# Altium schematic symbol library jlcpcb_2025_04_capacitors_extended_0402.schlib: 3594 symbols (part 1 of 20) (continued)
## 0402B105K6R3CT
designator C?  Capacitance: 1uF  (hidden comment: *)
Capacitor, Ceramic (MLCC), 1uF, 6.3V, X7R, SMD 0402; Manufacturer: Walsin Tech Corp; Manufacturer Part Number: 0402B105K6R3CT; Package Size: 0402; JLCPCB Basic Part: No; JLCPCB Part Number: C2918635; Supplier 1: LCSC; Category: Capacitors - MLCC; Supplier Part Number 1: C2918635; Voltage Rating: 6.3V; Temperature Coefficient: X7R; RoHS: Yes; ComponentLink1Description: Datasheet; ComponentLink1URL: https://wmsc.lcsc.com/wmsc/upload/file/pdf/v2/lcsc/2111171830_Walsin-Tech-Corp-0402B105K6R3CT_C2918635.pdf; ComponentLink2Description: JLCPCB Part URL; ComponentLink2URL: https://jlcpcb.com/partdetail/C2918635; ComponentLink3Description: LCSC Part URL; ComponentLink3URL: https://lcsc.com/product-detail/Multilayer-Ceramic-Capacitors-MLCC---SMD-SMT_Walsin-Tech-Corp-Walsin-Tech-Corp-0402B105K6R3CT_C2918635.html
footprint CAP-0402 (0402 (1005M) Capacitor)
pins: 1, 2

## 0402B105K6R3NT
designator C?  Capacitance: 1uF  (hidden comment: *)
Capacitor, Ceramic (MLCC), 1uF, ±10%, 6.3V, X7R, ±10%, SMD 0402; Manufacturer: FH (Guangdong Fenghua Advanced Tech); Manufacturer Part Number: 0402B105K6R3NT; Package Size: 0402; JLCPCB Basic Part: No; JLCPCB Part Number: C5445354; Supplier 1: LCSC; Category: Capacitors - MLCC; Supplier Part Number 1: C5445354; Tolerance: ±10%; Voltage Rating: 6.3V; Temperature Coefficient: X7R; RoHS: Yes; ComponentLink1Description: Datasheet; ComponentLink1URL: https://wmsc.lcsc.com/wmsc/upload/file/pdf/v2/lcsc/2304271702_FH--Guangdong-Fenghua-Advanced-Tech-0402B105K6R3NT_C5445354.pdf; ComponentLink2Description: JLCPCB Part URL; ComponentLink2URL: https://jlcpcb.com/partdetail/C5445354; ComponentLink3Description: LCSC Part URL; ComponentLink3URL: https://lcsc.com/product-detail/Multilayer-Ceramic-Capacitors-MLCC---SMD-SMT_FH-Guangdong-Fenghua-Advanced-Tech-FH-Guangdong-Fenghua-Advanced-Tech-0402B105K6R3NT_C5445354.html
footprint CAP-0402 (0402 (1005M) Capacitor)
pins: 1, 2

## 0402B121K500CT
designator C?  Capacitance: 120pF  (hidden comment: *)
Capacitor, Ceramic (MLCC), 120pF, ±10%, 50V, X7R, ±10%, SMD 0402; Manufacturer: Walsin Tech Corp; Manufacturer Part Number: 0402B121K500CT; Package Size: 0402; JLCPCB Basic Part: No; JLCPCB Part Number: C152813; Supplier 1: LCSC; Category: Capacitors - MLCC; Supplier Part Number 1: C152813; Tolerance: ±10%; Voltage Rating: 50V; Temperature Coefficient: X7R; RoHS: Yes; ComponentLink1Description: Datasheet; ComponentLink1URL: https://wmsc.lcsc.com/wmsc/upload/file/pdf/v2/lcsc/2304140030_Walsin-Tech-Corp-0402B121K500CT_C152813.pdf; ComponentLink2Description: JLCPCB Part URL; ComponentLink2URL: https://jlcpcb.com/partdetail/C152813; ComponentLink3Description: LCSC Part URL; ComponentLink3URL: https://lcsc.com/product-detail/Multilayer-Ceramic-Capacitors-MLCC---SMD-SMT_Walsin-Tech-Corp-Walsin-Tech-Corp-0402B121K500CT_C152813.html
footprint CAP-0402 (0402 (1005M) Capacitor)
pins: 1, 2

## 0402B121K500NT
designator C?  Capacitance: 120pF  (hidden comment: *)
Capacitor, Ceramic (MLCC), 120pF, ±10%, 50V, X7R, ±10%, SMD 0402; Manufacturer: FH(Guangdong Fenghua Advanced Tech); Manufacturer Part Number: 0402B121K500NT; Package Size: 0402; JLCPCB Basic Part: No; JLCPCB Part Number: C285005; Supplier 1: LCSC; Category: Capacitors - MLCC; Supplier Part Number 1: C285005; Tolerance: ±10%; Voltage Rating: 50V; Temperature Coefficient: X7R; RoHS: Yes; ComponentLink1Description: Datasheet; ComponentLink1URL: https://wmsc.lcsc.com/wmsc/upload/file/pdf/v2/lcsc/2304140030_FH--Guangdong-Fenghua-Advanced-Tech-0402B121K500NT_C285005.pdf; ComponentLink2Description: JLCPCB Part URL; ComponentLink2URL: https://jlcpcb.com/partdetail/C285005; ComponentLink3Description: LCSC Part URL; ComponentLink3URL: https://lcsc.com/product-detail/Multilayer-Ceramic-Capacitors-MLCC---SMD-SMT_FH-Guangdong-Fenghua-Advanced-Tech-FH-Guangdong-Fenghua-Advanced-Tech-0402B121K500NT_C285005.html
footprint CAP-0402 (0402 (1005M) Capacitor)
pins: 1, 2

## 0402B122J500CT
designator C?  Capacitance: 1.2nF  (hidden comment: *)
Capacitor, Ceramic (MLCC), 1.2nF, ±5%, 50V, X7R, ±5%, SMD 0402; Manufacturer: Walsin Tech Corp; Manufacturer Part Number: 0402B122J500CT; Package Size: 0402; JLCPCB Basic Part: No; JLCPCB Part Number: C295919; Supplier 1: LCSC; Category: Capacitors - MLCC; Supplier Part Number 1: C295919; Tolerance: ±5%; Voltage Rating: 50V; Temperature Coefficient: X7R; RoHS: Yes; ComponentLink1Description: Datasheet; ComponentLink1URL: https://wmsc.lcsc.com/wmsc/upload/file/pdf/v2/lcsc/2304140030_Walsin-Tech-Corp-0402B122J500CT_C295919.pdf; ComponentLink2Description: JLCPCB Part URL; ComponentLink2URL: https://jlcpcb.com/partdetail/C295919; ComponentLink3Description: LCSC Part URL; ComponentLink3URL: https://lcsc.com/product-detail/Multilayer-Ceramic-Capacitors-MLCC---SMD-SMT_Walsin-Tech-Corp-Walsin-Tech-Corp-0402B122J500CT_C295919.html
footprint CAP-0402 (0402 (1005M) Capacitor)
pins: 1, 2

## 0402B122K250CT
designator C?  Capacitance: 1.2nF  (hidden comment: *)
Capacitor, Ceramic (MLCC), 1.2nF, ±10%, 25V, X7R, ±10%, SMD 0402; Manufacturer: Walsin Tech Corp; Manufacturer Part Number: 0402B122K250CT; Package Size: 0402; JLCPCB Basic Part: No; JLCPCB Part Number: C458850; Supplier 1: LCSC; Category: Capacitors - MLCC; Supplier Part Number 1: C458850; Tolerance: ±10%; Voltage Rating: 25V; Temperature Coefficient: X7R; RoHS: Yes; ComponentLink1Description: Datasheet; ComponentLink1URL: https://wmsc.lcsc.com/wmsc/upload/file/pdf/v2/lcsc/2304140030_Walsin-Tech-Corp-0402B122K250CT_C458850.pdf; ComponentLink2Description: JLCPCB Part URL; ComponentLink2URL: https://jlcpcb.com/partdetail/C458850; ComponentLink3Description: LCSC Part URL; ComponentLink3URL: https://lcsc.com/product-detail/Multilayer-Ceramic-Capacitors-MLCC---SMD-SMT_Walsin-Tech-Corp-Walsin-Tech-Corp-0402B122K250CT_C458850.html
footprint CAP-0402 (0402 (1005M) Capacitor)
pins: 1, 2

## 0402B122K500CT
designator C?  Capacitance: 1.2nF  (hidden comment: *)
Capacitor, Ceramic (MLCC), 1.2nF, ±10%, 50V, X7R, ±10%, SMD 0402; Manufacturer: Walsin Tech Corp; Manufacturer Part Number: 0402B122K500CT; Package Size: 0402; JLCPCB Basic Part: No; JLCPCB Part Number: C295920; Supplier 1: LCSC; Category: Capacitors - MLCC; Supplier Part Number 1: C295920; Tolerance: ±10%; Voltage Rating: 50V; Temperature Coefficient: X7R; RoHS: Yes; ComponentLink1Description: Datasheet; ComponentLink1URL: https://wmsc.lcsc.com/wmsc/upload/file/pdf/v2/lcsc/2304140030_Walsin-Tech-Corp-0402B122K500CT_C295920.pdf; ComponentLink2Description: JLCPCB Part URL; ComponentLink2URL: https://jlcpcb.com/partdetail/C295920; ComponentLink3Description: LCSC Part URL; ComponentLink3URL: https://lcsc.com/product-detail/Multilayer-Ceramic-Capacitors-MLCC---SMD-SMT_Walsin-Tech-Corp-Walsin-Tech-Corp-0402B122K500CT_C295920.html
footprint CAP-0402 (0402 (1005M) Capacitor)
pins: 1, 2

## 0402B122K500NT
designator C?  Capacitance: 1.2nF  (hidden comment: *)
Capacitor, Ceramic (MLCC), 1.2nF, ±10%, 50V, X7R, ±10%, SMD 0402; Manufacturer: FH(Guangdong Fenghua Advanced Tech); Manufacturer Part Number: 0402B122K500NT; Package Size: 0402; JLCPCB Basic Part: No; JLCPCB Part Number: C192386; Supplier 1: LCSC; Category: Capacitors - MLCC; Supplier Part Number 1: C192386; Tolerance: ±10%; Voltage Rating: 50V; Temperature Coefficient: X7R; RoHS: Yes; ComponentLink1Description: Datasheet; ComponentLink1URL: https://wmsc.lcsc.com/wmsc/upload/file/pdf/v2/lcsc/1811141751_FH--Guangdong-Fenghua-Advanced-Tech-0402B122K500NT_C192386.pdf; ComponentLink2Description: JLCPCB Part URL; ComponentLink2URL: https://jlcpcb.com/partdetail/C192386; ComponentLink3Description: LCSC Part URL; ComponentLink3URL: https://lcsc.com/product-detail/Multilayer-Ceramic-Capacitors-MLCC---SMD-SMT_FH-Guangdong-Fenghua-Advanced-Tech-FH-Guangdong-Fenghua-Advanced-Tech-0402B122K500NT_C192386.html
footprint CAP-0402 (0402 (1005M) Capacitor)
pins: 1, 2

## 0402B122M500CT
designator C?  Capacitance: 1.2nF  (hidden comment: *)
Capacitor, Ceramic (MLCC), 1.2nF, ±20%, 50V, X7R, ±20%, SMD 0402; Manufacturer: Walsin Tech Corp; Manufacturer Part Number: 0402B122M500CT; Package Size: 0402; JLCPCB Basic Part: No; JLCPCB Part Number: C295921; Supplier 1: LCSC; Category: Capacitors - MLCC; Supplier Part Number 1: C295921; Tolerance: ±20%; Voltage Rating: 50V; Temperature Coefficient: X7R; RoHS: Yes; ComponentLink1Description: Datasheet; ComponentLink1URL: https://wmsc.lcsc.com/wmsc/upload/file/pdf/v2/lcsc/2304140030_Walsin-Tech-Corp-0402B122M500CT_C295921.pdf; ComponentLink2Description: JLCPCB Part URL; ComponentLink2URL: https://jlcpcb.com/partdetail/C295921; ComponentLink3Description: LCSC Part URL; ComponentLink3URL: https://lcsc.com/product-detail/Multilayer-Ceramic-Capacitors-MLCC---SMD-SMT_Walsin-Tech-Corp-Walsin-Tech-Corp-0402B122M500CT_C295921.html
footprint CAP-0402 (0402 (1005M) Capacitor)
pins: 1, 2

## 0402B123K250CT
designator C?  Capacitance: 12nF  (hidden comment: *)
Capacitor, Ceramic (MLCC), 12nF, ±10%, 25V, X7R, ±10%, SMD 0402; Manufacturer: Walsin Tech Corp; Manufacturer Part Number: 0402B123K250CT; Package Size: 0402; JLCPCB Basic Part: No; JLCPCB Part Number: C152812; Supplier 1: LCSC; Category: Capacitors - MLCC; Supplier Part Number 1: C152812; Tolerance: ±10%; Voltage Rating: 25V; Temperature Coefficient: X7R; RoHS: Yes; ComponentLink1Description: Datasheet; ComponentLink1URL: https://wmsc.lcsc.com/wmsc/upload/file/pdf/v2/lcsc/2304140030_Walsin-Tech-Corp-0402B123K250CT_C152812.pdf; ComponentLink2Description: JLCPCB Part URL; ComponentLink2URL: https://jlcpcb.com/partdetail/C152812; ComponentLink3Description: LCSC Part URL; ComponentLink3URL: https://lcsc.com/product-detail/Multilayer-Ceramic-Capacitors-MLCC---SMD-SMT_Walsin-Tech-Corp-Walsin-Tech-Corp-0402B123K250CT_C152812.html
footprint CAP-0402 (0402 (1005M) Capacitor)
pins: 1, 2

## 0402B123K500CT
designator C?  Capacitance: 12nF  (hidden comment: *)
Capacitor, Ceramic (MLCC), 12nF, ±10%, 50V, X7R, ±10%, SMD 0402; Manufacturer: Walsin Tech Corp; Manufacturer Part Number: 0402B123K500CT; Package Size: 0402; JLCPCB Basic Part: No; JLCPCB Part Number: C908520; Supplier 1: LCSC; Category: Capacitors - MLCC; Supplier Part Number 1: C908520; Tolerance: ±10%; Voltage Rating: 50V; Temperature Coefficient: X7R; RoHS: Yes; ComponentLink1Description: Datasheet; ComponentLink1URL: https://wmsc.lcsc.com/wmsc/upload/file/pdf/v2/lcsc/2010271906_Walsin-Tech-Corp-0402B123K500CT_C908520.pdf; ComponentLink2Description: JLCPCB Part URL; ComponentLink2URL: https://jlcpcb.com/partdetail/C908520; ComponentLink3Description: LCSC Part URL; ComponentLink3URL: https://lcsc.com/product-detail/Multilayer-Ceramic-Capacitors-MLCC---SMD-SMT_Walsin-Tech-Corp-Walsin-Tech-Corp-0402B123K500CT_C908520.html
footprint CAP-0402 (0402 (1005M) Capacitor)
pins: 1, 2

## 0402B151K500CT
designator C?  Capacitance: 150pF  (hidden comment: *)
Capacitor, Ceramic (MLCC), 150pF, ±10%, 50V, X7R, ±10%, SMD 0402; Manufacturer: Walsin Tech Corp; Manufacturer Part Number: 0402B151K500CT; Package Size: 0402; JLCPCB Basic Part: No; JLCPCB Part Number: C152811; Supplier 1: LCSC; Category: Capacitors - MLCC; Supplier Part Number 1: C152811; Tolerance: ±10%; Voltage Rating: 50V; Temperature Coefficient: X7R; RoHS: Yes; ComponentLink1Description: Datasheet; ComponentLink1URL: https://wmsc.lcsc.com/wmsc/upload/file/pdf/v2/lcsc/2304140030_Walsin-Tech-Corp-0402B151K500CT_C152811.pdf; ComponentLink2Description: JLCPCB Part URL; ComponentLink2URL: https://jlcpcb.com/partdetail/C152811; ComponentLink3Description: LCSC Part URL; ComponentLink3URL: https://lcsc.com/product-detail/Multilayer-Ceramic-Capacitors-MLCC---SMD-SMT_Walsin-Tech-Corp-Walsin-Tech-Corp-0402B151K500CT_C152811.html
footprint CAP-0402 (0402 (1005M) Capacitor)
pins: 1, 2

## 0402B151K500NT
designator C?  Capacitance: 150pF  (hidden comment: *)
Capacitor, Ceramic (MLCC), 150pF, ±10%, 50V, X7R, ±10%, SMD 0402; Manufacturer: FH(Guangdong Fenghua Advanced Tech); Manufacturer Part Number: 0402B151K500NT; Package Size: 0402; JLCPCB Basic Part: No; JLCPCB Part Number: C1527; Supplier 1: LCSC; Category: Capacitors - MLCC; Supplier Part Number 1: C1527; Tolerance: ±10%; Voltage Rating: 50V; Temperature Coefficient: X7R; RoHS: Yes; ComponentLink1Description: Datasheet; ComponentLink1URL: https://wmsc.lcsc.com/wmsc/upload/file/pdf/v2/lcsc/2304140030_FH--Guangdong-Fenghua-Advanced-Tech-0402B151K500NT_C1527.pdf; ComponentLink2Description: JLCPCB Part URL; ComponentLink2URL: https://jlcpcb.com/partdetail/C1527; ComponentLink3Description: LCSC Part URL; ComponentLink3URL: https://lcsc.com/product-detail/Multilayer-Ceramic-Capacitors-MLCC---SMD-SMT_FH-Guangdong-Fenghua-Advanced-Tech-FH-Guangdong-Fenghua-Advanced-Tech-0402B151K500NT_C1527.html
footprint CAP-0402 (0402 (1005M) Capacitor)
pins: 1, 2

## 0402B152J500CT
designator C?  Capacitance: 1.5nF  (hidden comment: *)
Capacitor, Ceramic (MLCC), 1.5nF, ±5%, 50V, X7R, ±5%, SMD 0402; Manufacturer: Walsin Tech Corp; Manufacturer Part Number: 0402B152J500CT; Package Size: 0402; JLCPCB Basic Part: No; JLCPCB Part Number: C424860; Supplier 1: LCSC; Category: Capacitors - MLCC; Supplier Part Number 1: C424860; Tolerance: ±5%; Voltage Rating: 50V; Temperature Coefficient: X7R; RoHS: Yes; ComponentLink1Description: Datasheet; ComponentLink1URL: https://wmsc.lcsc.com/wmsc/upload/file/pdf/v2/lcsc/2304140030_Walsin-Tech-Corp-0402B152J500CT_C424860.pdf; ComponentLink2Description: JLCPCB Part URL; ComponentLink2URL: https://jlcpcb.com/partdetail/C424860; ComponentLink3Description: LCSC Part URL; ComponentLink3URL: https://lcsc.com/product-detail/Multilayer-Ceramic-Capacitors-MLCC---SMD-SMT_Walsin-Tech-Corp-Walsin-Tech-Corp-0402B152J500CT_C424860.html
footprint CAP-0402 (0402 (1005M) Capacitor)
pins: 1, 2

## 0402B152K160CT
designator C?  Capacitance: 1.5nF  (hidden comment: *)
Capacitor, Ceramic (MLCC), 1.5nF, ±10%, 16V, X7R, ±10%, SMD 0402; Manufacturer: Walsin Tech Corp; Manufacturer Part Number: 0402B152K160CT; Package Size: 0402; JLCPCB Basic Part: No; JLCPCB Part Number: C424827; Supplier 1: LCSC; Category: Capacitors - MLCC; Supplier Part Number 1: C424827; Tolerance: ±10%; Voltage Rating: 16V; Temperature Coefficient: X7R; RoHS: Yes; ComponentLink1Description: Datasheet; ComponentLink1URL: https://wmsc.lcsc.com/wmsc/upload/file/pdf/v2/lcsc/2304140030_Walsin-Tech-Corp-0402B152K160CT_C424827.pdf; ComponentLink2Description: JLCPCB Part URL; ComponentLink2URL: https://jlcpcb.com/partdetail/C424827; ComponentLink3Description: LCSC Part URL; ComponentLink3URL: https://lcsc.com/product-detail/Multilayer-Ceramic-Capacitors-MLCC---SMD-SMT_Walsin-Tech-Corp-Walsin-Tech-Corp-0402B152K160CT_C424827.html
footprint CAP-0402 (0402 (1005M) Capacitor)
pins: 1, 2

## 0402B152K500CT
designator C?  Capacitance: 1.5nF  (hidden comment: *)
Capacitor, Ceramic (MLCC), 1.5nF, ±10%, 50V, X7R, ±10%, SMD 0402; Manufacturer: Walsin Tech Corp; Manufacturer Part Number: 0402B152K500CT; Package Size: 0402; JLCPCB Basic Part: No; JLCPCB Part Number: C123440; Supplier 1: LCSC; Category: Capacitors - MLCC; Supplier Part Number 1: C123440; Tolerance: ±10%; Voltage Rating: 50V; Temperature Coefficient: X7R; RoHS: Yes; ComponentLink1Description: Datasheet; ComponentLink1URL: https://wmsc.lcsc.com/wmsc/upload/file/pdf/v2/lcsc/2304140030_Walsin-Tech-Corp-0402B152K500CT_C123440.pdf; ComponentLink2Description: JLCPCB Part URL; ComponentLink2URL: https://jlcpcb.com/partdetail/C123440; ComponentLink3Description: LCSC Part URL; ComponentLink3URL: https://lcsc.com/product-detail/Multilayer-Ceramic-Capacitors-MLCC---SMD-SMT_Walsin-Tech-Corp-Walsin-Tech-Corp-0402B152K500CT_C123440.html
footprint CAP-0402 (0402 (1005M) Capacitor)
pins: 1, 2

## 0402B152K500NT
designator C?  Capacitance: 1.5nF  (hidden comment: *)
Capacitor, Ceramic (MLCC), 1.5nF, ±10%, 50V, X7R, ±10%, SMD 0402; Manufacturer: FH(Guangdong Fenghua Advanced Tech); Manufacturer Part Number: 0402B152K500NT; Package Size: 0402; JLCPCB Basic Part: No; JLCPCB Part Number: C284989; Supplier 1: LCSC; Category: Capacitors - MLCC; Supplier Part Number 1: C284989; Tolerance: ±10%; Voltage Rating: 50V; Temperature Coefficient: X7R; RoHS: Yes; ComponentLink1Description: Datasheet; ComponentLink1URL: https://wmsc.lcsc.com/wmsc/upload/file/pdf/v2/lcsc/2304140030_FH--Guangdong-Fenghua-Advanced-Tech-0402B152K500NT_C284989.pdf; ComponentLink2Description: JLCPCB Part URL; ComponentLink2URL: https://jlcpcb.com/partdetail/C284989; ComponentLink3Description: LCSC Part URL; ComponentLink3URL: https://lcsc.com/product-detail/Multilayer-Ceramic-Capacitors-MLCC---SMD-SMT_FH-Guangdong-Fenghua-Advanced-Tech-FH-Guangdong-Fenghua-Advanced-Tech-0402B152K500NT_C284989.html
footprint CAP-0402 (0402 (1005M) Capacitor)
pins: 1, 2

## 0402B152M500CT
designator C?  Capacitance: 1.5nF  (hidden comment: *)
Capacitor, Ceramic (MLCC), 1.5nF, ±20%, 50V, X7R, ±20%, SMD 0402; Manufacturer: Walsin Tech Corp; Manufacturer Part Number: 0402B152M500CT; Package Size: 0402; JLCPCB Basic Part: No; JLCPCB Part Number: C295923; Supplier 1: LCSC; Category: Capacitors - MLCC; Supplier Part Number 1: C295923; Tolerance: ±20%; Voltage Rating: 50V; Temperature Coefficient: X7R; RoHS: Yes; ComponentLink1Description: Datasheet; ComponentLink1URL: https://wmsc.lcsc.com/wmsc/upload/file/pdf/v2/lcsc/2304140030_Walsin-Tech-Corp-0402B152M500CT_C295923.pdf; ComponentLink2Description: JLCPCB Part URL; ComponentLink2URL: https://jlcpcb.com/partdetail/C295923; ComponentLink3Description: LCSC Part URL; ComponentLink3URL: https://lcsc.com/product-detail/Multilayer-Ceramic-Capacitors-MLCC---SMD-SMT_Walsin-Tech-Corp-Walsin-Tech-Corp-0402B152M500CT_C295923.html
footprint CAP-0402 (0402 (1005M) Capacitor)
pins: 1, 2

## 0402B152M500NT
designator C?  Capacitance: 1.5nF  (hidden comment: *)
Capacitor, Ceramic (MLCC), 1.5nF, ±20%, 50V, X7R, ±20%, SMD 0402; Manufacturer: FH(Guangdong Fenghua Advanced Tech); Manufacturer Part Number: 0402B152M500NT; Package Size: 0402; JLCPCB Basic Part: No; JLCPCB Part Number: C285109; Supplier 1: LCSC; Category: Capacitors - MLCC; Supplier Part Number 1: C285109; Tolerance: ±20%; Voltage Rating: 50V; Temperature Coefficient: X7R; RoHS: Yes; ComponentLink1Description: Datasheet; ComponentLink1URL: https://wmsc.lcsc.com/wmsc/upload/file/pdf/v2/lcsc/2304140030_FH--Guangdong-Fenghua-Advanced-Tech-0402B152M500NT_C285109.pdf; ComponentLink2Description: JLCPCB Part URL; ComponentLink2URL: https://jlcpcb.com/partdetail/C285109; ComponentLink3Description: LCSC Part URL; ComponentLink3URL: https://lcsc.com/product-detail/Multilayer-Ceramic-Capacitors-MLCC---SMD-SMT_FH-Guangdong-Fenghua-Advanced-Tech-FH-Guangdong-Fenghua-Advanced-Tech-0402B152M500NT_C285109.html
footprint CAP-0402 (0402 (1005M) Capacitor)
pins: 1, 2

## 0402B153K100CT
designator C?  Capacitance: 15nF  (hidden comment: *)
Capacitor, Ceramic (MLCC), 15nF, ±10%, 10V, X7R, ±10%, SMD 0402; Manufacturer: Walsin Tech Corp; Manufacturer Part Number: 0402B153K100CT; Package Size: 0402; JLCPCB Basic Part: No; JLCPCB Part Number: C387942; Supplier 1: LCSC; Category: Capacitors - MLCC; Supplier Part Number 1: C387942; Tolerance: ±10%; Voltage Rating: 10V; Temperature Coefficient: X7R; RoHS: Yes; ComponentLink1Description: Datasheet; ComponentLink1URL: https://wmsc.lcsc.com/wmsc/upload/file/pdf/v2/lcsc/2304140030_Walsin-Tech-Corp-0402B153K100CT_C387942.pdf; ComponentLink2Description: JLCPCB Part URL; ComponentLink2URL: https://jlcpcb.com/partdetail/C387942; ComponentLink3Description: LCSC Part URL; ComponentLink3URL: https://lcsc.com/product-detail/Multilayer-Ceramic-Capacitors-MLCC---SMD-SMT_Walsin-Tech-Corp-Walsin-Tech-Corp-0402B153K100CT_C387942.html
footprint CAP-0402 (0402 (1005M) Capacitor)
pins: 1, 2

## 0402B153K160CT
designator C?  Capacitance: 15nF  (hidden comment: *)
Capacitor, Ceramic (MLCC), 15nF, ±10%, 16V, X7R, ±10%, SMD 0402; Manufacturer: Walsin Tech Corp; Manufacturer Part Number: 0402B153K160CT; Package Size: 0402; JLCPCB Basic Part: No; JLCPCB Part Number: C301932; Supplier 1: LCSC; Category: Capacitors - MLCC; Supplier Part Number 1: C301932; Tolerance: ±10%; Voltage Rating: 16V; Temperature Coefficient: X7R; RoHS: Yes; ComponentLink1Description: Datasheet; ComponentLink1URL: https://wmsc.lcsc.com/wmsc/upload/file/pdf/v2/lcsc/2304140030_Walsin-Tech-Corp-0402B153K160CT_C301932.pdf; ComponentLink2Description: JLCPCB Part URL; ComponentLink2URL: https://jlcpcb.com/partdetail/C301932; ComponentLink3Description: LCSC Part URL; ComponentLink3URL: https://lcsc.com/product-detail/Multilayer-Ceramic-Capacitors-MLCC---SMD-SMT_Walsin-Tech-Corp-Walsin-Tech-Corp-0402B153K160CT_C301932.html
footprint CAP-0402 (0402 (1005M) Capacitor)
pins: 1, 2

## 0402B153K250NT
designator C?  Capacitance: 15nF  (hidden comment: *)
Capacitor, Ceramic (MLCC), 15nF, ±10%, 25V, X7R, ±10%, SMD 0402; Manufacturer: FH(Guangdong Fenghua Advanced Tech); Manufacturer Part Number: 0402B153K250NT; Package Size: 0402; JLCPCB Basic Part: No; JLCPCB Part Number: C285020; Supplier 1: LCSC; Category: Capacitors - MLCC; Supplier Part Number 1: C285020; Tolerance: ±10%; Voltage Rating: 25V; Temperature Coefficient: X7R; RoHS: Yes; ComponentLink1Description: Datasheet; ComponentLink1URL: https://wmsc.lcsc.com/wmsc/upload/file/pdf/v2/lcsc/2304140030_FH--Guangdong-Fenghua-Advanced-Tech-0402B153K250NT_C285020.pdf; ComponentLink2Description: JLCPCB Part URL; ComponentLink2URL: https://jlcpcb.com/partdetail/C285020; ComponentLink3Description: LCSC Part URL; ComponentLink3URL: https://lcsc.com/product-detail/Multilayer-Ceramic-Capacitors-MLCC---SMD-SMT_FH-Guangdong-Fenghua-Advanced-Tech-FH-Guangdong-Fenghua-Advanced-Tech-0402B153K250NT_C285020.html
footprint CAP-0402 (0402 (1005M) Capacitor)
pins: 1, 2

## 0402B153K500CT
designator C?  Capacitance: 15nF  (hidden comment: *)
Capacitor, Ceramic (MLCC), 15nF, ±10%, 50V, X7R, ±10%, SMD 0402; Manufacturer: Walsin Tech Corp; Manufacturer Part Number: 0402B153K500CT; Package Size: 0402; JLCPCB Basic Part: No; JLCPCB Part Number: C2443197; Supplier 1: LCSC; Category: Capacitors - MLCC; Supplier Part Number 1: C2443197; Tolerance: ±10%; Voltage Rating: 50V; Temperature Coefficient: X7R; RoHS: Yes; ComponentLink1Description: Datasheet; ComponentLink1URL: https://wmsc.lcsc.com/wmsc/upload/file/pdf/v2/lcsc/2309201533_Walsin-Tech-Corp-0402B153K500CT_C2443197.pdf; ComponentLink2Description: JLCPCB Part URL; ComponentLink2URL: https://jlcpcb.com/partdetail/C2443197; ComponentLink3Description: LCSC Part URL; ComponentLink3URL: https://lcsc.com/product-detail/Multilayer-Ceramic-Capacitors-MLCC---SMD-SMT_Walsin-Tech-Corp-Walsin-Tech-Corp-0402B153K500CT_C2443197.html
footprint CAP-0402 (0402 (1005M) Capacitor)
pins: 1, 2

## 0402B153K500NT
designator C?  Capacitance: 15nF  (hidden comment: *)
Capacitor, Ceramic (MLCC), 15nF, ±10%, 50V, X7R, ±10%, SMD 0402; Manufacturer: FH(Guangdong Fenghua Advanced Tech); Manufacturer Part Number: 0402B153K500NT; Package Size: 0402; JLCPCB Basic Part: No; JLCPCB Part Number: C501821; Supplier 1: LCSC; Category: Capacitors - MLCC; Supplier Part Number 1: C501821; Tolerance: ±10%; Voltage Rating: 50V; Temperature Coefficient: X7R; RoHS: Yes; ComponentLink1Description: Datasheet; ComponentLink1URL: https://wmsc.lcsc.com/wmsc/upload/file/pdf/v2/lcsc/2304140030_FH--Guangdong-Fenghua-Advanced-Tech-0402B153K500NT_C501821.pdf; ComponentLink2Description: JLCPCB Part URL; ComponentLink2URL: https://jlcpcb.com/partdetail/C501821; ComponentLink3Description: LCSC Part URL; ComponentLink3URL: https://lcsc.com/product-detail/Multilayer-Ceramic-Capacitors-MLCC---SMD-SMT_FH-Guangdong-Fenghua-Advanced-Tech-FH-Guangdong-Fenghua-Advanced-Tech-0402B153K500NT_C501821.html
footprint CAP-0402 (0402 (1005M) Capacitor)
pins: 1, 2

## 0402B161K500NT
designator C?  Capacitance: 160pF  (hidden comment: *)
Capacitor, Ceramic (MLCC), 160pF, ±10%, 50V, X7R, ±10%, SMD 0402; Manufacturer: FH(Guangdong Fenghua Advanced Tech); Manufacturer Part Number: 0402B161K500NT; Package Size: 0402; JLCPCB Basic Part: No; JLCPCB Part Number: C1528; Supplier 1: LCSC; Category: Capacitors - MLCC; Supplier Part Number 1: C1528; Tolerance: ±10%; Voltage Rating: 50V; Temperature Coefficient: X7R; RoHS: Yes; ComponentLink1Description: Datasheet; ComponentLink1URL: https://wmsc.lcsc.com/wmsc/upload/file/pdf/v2/lcsc/2304140030_FH--Guangdong-Fenghua-Advanced-Tech-0402B161K500NT_C1528.pdf; ComponentLink2Description: JLCPCB Part URL; ComponentLink2URL: https://jlcpcb.com/partdetail/C1528; ComponentLink3Description: LCSC Part URL; ComponentLink3URL: https://lcsc.com/product-detail/Multilayer-Ceramic-Capacitors-MLCC---SMD-SMT_FH-Guangdong-Fenghua-Advanced-Tech-FH-Guangdong-Fenghua-Advanced-Tech-0402B161K500NT_C1528.html
footprint CAP-0402 (0402 (1005M) Capacitor)
pins: 1, 2

## 0402B181K500CT
designator C?  Capacitance: 180pF  (hidden comment: *)
Capacitor, Ceramic (MLCC), 180pF, ±10%, 50V, X7R, ±10%, SMD 0402; Manufacturer: Walsin Tech Corp; Manufacturer Part Number: 0402B181K500CT; Package Size: 0402; JLCPCB Basic Part: No; JLCPCB Part Number: C338156; Supplier 1: LCSC; Category: Capacitors - MLCC; Supplier Part Number 1: C338156; Tolerance: ±10%; Voltage Rating: 50V; Temperature Coefficient: X7R; RoHS: Yes; ComponentLink1Description: Datasheet; ComponentLink1URL: https://wmsc.lcsc.com/wmsc/upload/file/pdf/v2/lcsc/2304140030_Walsin-Tech-Corp-0402B181K500CT_C338156.pdf; ComponentLink2Description: JLCPCB Part URL; ComponentLink2URL: https://jlcpcb.com/partdetail/C338156; ComponentLink3Description: LCSC Part URL; ComponentLink3URL: https://lcsc.com/product-detail/Multilayer-Ceramic-Capacitors-MLCC---SMD-SMT_Walsin-Tech-Corp-Walsin-Tech-Corp-0402B181K500CT_C338156.html
footprint CAP-0402 (0402 (1005M) Capacitor)
pins: 1, 2

## 0402B181K500NT
designator C?  Capacitance: 180pF  (hidden comment: *)
Capacitor, Ceramic (MLCC), 180pF, ±10%, 50V, X7R, ±10%, SMD 0402; Manufacturer: FH(Guangdong Fenghua Advanced Tech); Manufacturer Part Number: 0402B181K500NT; Package Size: 0402; JLCPCB Basic Part: No; JLCPCB Part Number: C285199; Supplier 1: LCSC; Category: Capacitors - MLCC; Supplier Part Number 1: C285199; Tolerance: ±10%; Voltage Rating: 50V; Temperature Coefficient: X7R; RoHS: Yes; ComponentLink1Description: Datasheet; ComponentLink1URL: https://wmsc.lcsc.com/wmsc/upload/file/pdf/v2/lcsc/2304140030_FH--Guangdong-Fenghua-Advanced-Tech-0402B181K500NT_C285199.pdf; ComponentLink2Description: JLCPCB Part URL; ComponentLink2URL: https://jlcpcb.com/partdetail/C285199; ComponentLink3Description: LCSC Part URL; ComponentLink3URL: https://lcsc.com/product-detail/Multilayer-Ceramic-Capacitors-MLCC---SMD-SMT_FH-Guangdong-Fenghua-Advanced-Tech-FH-Guangdong-Fenghua-Advanced-Tech-0402B181K500NT_C285199.html
footprint CAP-0402 (0402 (1005M) Capacitor)
pins: 1, 2

## 0402B182J500CT
designator C?  Capacitance: 1.8nF  (hidden comment: *)
Capacitor, Ceramic (MLCC), 1.8nF, ±5%, 50V, X7R, ±5%, SMD 0402; Manufacturer: Walsin Tech Corp; Manufacturer Part Number: 0402B182J500CT; Package Size: 0402; JLCPCB Basic Part: No; JLCPCB Part Number: C458851; Supplier 1: LCSC; Category: Capacitors - MLCC; Supplier Part Number 1: C458851; Tolerance: ±5%; Voltage Rating: 50V; Temperature Coefficient: X7R; RoHS: Yes; ComponentLink1Description: Datasheet; ComponentLink1URL: https://wmsc.lcsc.com/wmsc/upload/file/pdf/v2/lcsc/2304140030_Walsin-Tech-Corp-0402B182J500CT_C458851.pdf; ComponentLink2Description: JLCPCB Part URL; ComponentLink2URL: https://jlcpcb.com/partdetail/C458851; ComponentLink3Description: LCSC Part URL; ComponentLink3URL: https://lcsc.com/product-detail/Multilayer-Ceramic-Capacitors-MLCC---SMD-SMT_Walsin-Tech-Corp-Walsin-Tech-Corp-0402B182J500CT_C458851.html
footprint CAP-0402 (0402 (1005M) Capacitor)
pins: 1, 2

## 0402B182K160CT
designator C?  Capacitance: 1.8nF  (hidden comment: *)
Capacitor, Ceramic (MLCC), 1.8nF, ±10%, 16V, X7R, ±10%, SMD 0402; Manufacturer: Walsin Tech Corp; Manufacturer Part Number: 0402B182K160CT; Package Size: 0402; JLCPCB Basic Part: No; JLCPCB Part Number: C424822; Supplier 1: LCSC; Category: Capacitors - MLCC; Supplier Part Number 1: C424822; Tolerance: ±10%; Voltage Rating: 16V; Temperature Coefficient: X7R; RoHS: Yes; ComponentLink1Description: Datasheet; ComponentLink1URL: https://wmsc.lcsc.com/wmsc/upload/file/pdf/v2/lcsc/2304140030_Walsin-Tech-Corp-0402B182K160CT_C424822.pdf; ComponentLink2Description: JLCPCB Part URL; ComponentLink2URL: https://jlcpcb.com/partdetail/C424822; ComponentLink3Description: LCSC Part URL; ComponentLink3URL: https://lcsc.com/product-detail/Multilayer-Ceramic-Capacitors-MLCC---SMD-SMT_Walsin-Tech-Corp-Walsin-Tech-Corp-0402B182K160CT_C424822.html
footprint CAP-0402 (0402 (1005M) Capacitor)
pins: 1, 2

## 0402B182K500NT
designator C?  Capacitance: 1.8nF  (hidden comment: *)
Capacitor, Ceramic (MLCC), 1.8nF, ±10%, 50V, X7R, ±10%, SMD 0402; Manufacturer: FH(Guangdong Fenghua Advanced Tech); Manufacturer Part Number: 0402B182K500NT; Package Size: 0402; JLCPCB Basic Part: No; JLCPCB Part Number: C301933; Supplier 1: LCSC; Category: Capacitors - MLCC; Supplier Part Number 1: C301933; Tolerance: ±10%; Voltage Rating: 50V; Temperature Coefficient: X7R; RoHS: Yes; ComponentLink1Description: Datasheet; ComponentLink1URL: https://wmsc.lcsc.com/wmsc/upload/file/pdf/v2/lcsc/2304140030_FH--Guangdong-Fenghua-Advanced-Tech-0402B182K500NT_C301933.pdf; ComponentLink2Description: JLCPCB Part URL; ComponentLink2URL: https://jlcpcb.com/partdetail/C301933; ComponentLink3Description: LCSC Part URL; ComponentLink3URL: https://lcsc.com/product-detail/Multilayer-Ceramic-Capacitors-MLCC---SMD-SMT_FH-Guangdong-Fenghua-Advanced-Tech-FH-Guangdong-Fenghua-Advanced-Tech-0402B182K500NT_C301933.html
footprint CAP-0402 (0402 (1005M) Capacitor)
pins: 1, 2

## 0402B183K160CT
designator C?  Capacitance: 18nF  (hidden comment: *)
Capacitor, Ceramic (MLCC), 18nF, ±10%, 16V, X7R, ±10%, SMD 0402; Manufacturer: Walsin Tech Corp; Manufacturer Part Number: 0402B183K160CT; Package Size: 0402; JLCPCB Basic Part: No; JLCPCB Part Number: C387944; Supplier 1: LCSC; Category: Capacitors - MLCC; Supplier Part Number 1: C387944; Tolerance: ±10%; Voltage Rating: 16V; Temperature Coefficient: X7R; RoHS: Yes; ComponentLink1Description: Datasheet; ComponentLink1URL: https://wmsc.lcsc.com/wmsc/upload/file/pdf/v2/lcsc/2304140030_Walsin-Tech-Corp-0402B183K160CT_C387944.pdf; ComponentLink2Description: JLCPCB Part URL; ComponentLink2URL: https://jlcpcb.com/partdetail/C387944; ComponentLink3Description: LCSC Part URL; ComponentLink3URL: https://lcsc.com/product-detail/Multilayer-Ceramic-Capacitors-MLCC---SMD-SMT_Walsin-Tech-Corp-Walsin-Tech-Corp-0402B183K160CT_C387944.html
footprint CAP-0402 (0402 (1005M) Capacitor)
pins: 1, 2

## 0402B183K250CT
designator C?  Capacitance: 18nF  (hidden comment: *)
Capacitor, Ceramic (MLCC), 18nF, ±10%, 25V, X7R, ±10%, SMD 0402; Manufacturer: Walsin Tech Corp; Manufacturer Part Number: 0402B183K250CT; Package Size: 0402; JLCPCB Basic Part: No; JLCPCB Part Number: C387945; Supplier 1: LCSC; Category: Capacitors - MLCC; Supplier Part Number 1: C387945; Tolerance: ±10%; Voltage Rating: 25V; Temperature Coefficient: X7R; RoHS: Yes; ComponentLink1Description: Datasheet; ComponentLink1URL: https://wmsc.lcsc.com/wmsc/upload/file/pdf/v2/lcsc/2304140030_Walsin-Tech-Corp-0402B183K250CT_C387945.pdf; ComponentLink2Description: JLCPCB Part URL; ComponentLink2URL: https://jlcpcb.com/partdetail/C387945; ComponentLink3Description: LCSC Part URL; ComponentLink3URL: https://lcsc.com/product-detail/Multilayer-Ceramic-Capacitors-MLCC---SMD-SMT_Walsin-Tech-Corp-Walsin-Tech-Corp-0402B183K250CT_C387945.html
footprint CAP-0402 (0402 (1005M) Capacitor)
pins: 1, 2

## 0402B183K250NT
designator C?  Capacitance: 18000pF  (hidden comment: *)
Capacitor, Ceramic (MLCC), 18000pF, ±10%, 25V, X7R, ±10%, SMD 0402; Manufacturer: FH (Guangdong Fenghua Advanced Tech); Manufacturer Part Number: 0402B183K250NT; Package Size: 0402; JLCPCB Basic Part: No; JLCPCB Part Number: C967565; Supplier 1: LCSC; Category: Capacitors - MLCC; Supplier Part Number 1: C967565; Tolerance: ±10%; Voltage Rating: 25V; Temperature Coefficient: X7R; RoHS: Yes; ComponentLink1Description: Datasheet; ComponentLink1URL: https://wmsc.lcsc.com/wmsc/upload/file/pdf/v2/lcsc/2304140030_FH--Guangdong-Fenghua-Advanced-Tech-0402B183K250NT_C967565.pdf; ComponentLink2Description: JLCPCB Part URL; ComponentLink2URL: https://jlcpcb.com/partdetail/C967565; ComponentLink3Description: LCSC Part URL; ComponentLink3URL: https://lcsc.com/product-detail/Multilayer-Ceramic-Capacitors-MLCC---SMD-SMT_FH-Guangdong-Fenghua-Advanced-Tech-FH-Guangdong-Fenghua-Advanced-Tech-0402B183K250NT_C967565.html
footprint CAP-0402 (0402 (1005M) Capacitor)
pins: 1, 2

## 0402B201K500NT
designator C?  Capacitance: 200pF  (hidden comment: *)
Capacitor, Ceramic (MLCC), 200pF, ±10%, 50V, X7R, ±10%, SMD 0402; Manufacturer: FH(Guangdong Fenghua Advanced Tech); Manufacturer Part Number: 0402B201K500NT; Package Size: 0402; JLCPCB Basic Part: No; JLCPCB Part Number: C1529; Supplier 1: LCSC; Category: Capacitors - MLCC; Supplier Part Number 1: C1529; Tolerance: ±10%; Voltage Rating: 50V; Temperature Coefficient: X7R; RoHS: Yes; ComponentLink1Description: Datasheet; ComponentLink1URL: https://wmsc.lcsc.com/wmsc/upload/file/pdf/v2/lcsc/2304140030_FH--Guangdong-Fenghua-Advanced-Tech-0402B201K500NT_C1529.pdf; ComponentLink2Description: JLCPCB Part URL; ComponentLink2URL: https://jlcpcb.com/partdetail/C1529; ComponentLink3Description: LCSC Part URL; ComponentLink3URL: https://lcsc.com/product-detail/Multilayer-Ceramic-Capacitors-MLCC---SMD-SMT_FH-Guangdong-Fenghua-Advanced-Tech-FH-Guangdong-Fenghua-Advanced-Tech-0402B201K500NT_C1529.html
footprint CAP-0402 (0402 (1005M) Capacitor)
pins: 1, 2

## 0402B202K500CT
designator C?  Capacitance: 2nF  (hidden comment: *)
Capacitor, Ceramic (MLCC), 2nF, ±10%, 50V, X7R, ±10%, SMD 0402; Manufacturer: Walsin Tech Corp; Manufacturer Part Number: 0402B202K500CT; Package Size: 0402; JLCPCB Basic Part: No; JLCPCB Part Number: C152805; Supplier 1: LCSC; Category: Capacitors - MLCC; Supplier Part Number 1: C152805; Tolerance: ±10%; Voltage Rating: 50V; Temperature Coefficient: X7R; RoHS: Yes; ComponentLink1Description: Datasheet; ComponentLink1URL: https://wmsc.lcsc.com/wmsc/upload/file/pdf/v2/lcsc/2304140030_Walsin-Tech-Corp-0402B202K500CT_C152805.pdf; ComponentLink2Description: JLCPCB Part URL; ComponentLink2URL: https://jlcpcb.com/partdetail/C152805; ComponentLink3Description: LCSC Part URL; ComponentLink3URL: https://lcsc.com/product-detail/Multilayer-Ceramic-Capacitors-MLCC---SMD-SMT_Walsin-Tech-Corp-Walsin-Tech-Corp-0402B202K500CT_C152805.html
footprint CAP-0402 (0402 (1005M) Capacitor)
pins: 1, 2

## 0402B202K500NT
designator C?  Capacitance: 2nF  (hidden comment: *)
Capacitor, Ceramic (MLCC), 2nF, ±10%, 50V, ±10%, SMD 0402; Manufacturer: FH(Guangdong Fenghua Advanced Tech); Manufacturer Part Number: 0402B202K500NT; Package Size: 0402; JLCPCB Basic Part: No; JLCPCB Part Number: C2836763; Supplier 1: LCSC; Category: Capacitors - MLCC; Supplier Part Number 1: C2836763; Tolerance: ±10%; Voltage Rating: 50V; RoHS: Yes; ComponentLink1Description: Datasheet; ComponentLink1URL: https://wmsc.lcsc.com/wmsc/upload/file/pdf/v2/lcsc/2304140030_FH--Guangdong-Fenghua-Advanced-Tech-0402B202K500NT_C2836763.pdf; ComponentLink2Description: JLCPCB Part URL; ComponentLink2URL: https://jlcpcb.com/partdetail/C2836763; ComponentLink3Description: LCSC Part URL; ComponentLink3URL: https://lcsc.com/product-detail/Multilayer-Ceramic-Capacitors-MLCC---SMD-SMT_FH-Guangdong-Fenghua-Advanced-Tech-FH-Guangdong-Fenghua-Advanced-Tech-0402B202K500NT_C2836763.html
footprint CAP-0402 (0402 (1005M) Capacitor)
pins: 1, 2

## 0402B203K160NT
designator C?  Capacitance: 20nF  (hidden comment: *)
Capacitor, Ceramic (MLCC), 20nF, ±10%, 16V, ±10%, SMD 0402; Manufacturer: FH(Guangdong Fenghua Advanced Tech); Manufacturer Part Number: 0402B203K160NT; Package Size: 0402; JLCPCB Basic Part: No; JLCPCB Part Number: C1322352; Supplier 1: LCSC; Category: Capacitors - MLCC; Supplier Part Number 1: C1322352; Tolerance: ±10%; Voltage Rating: 16V; RoHS: Yes; ComponentLink1Description: Datasheet; ComponentLink1URL: https://wmsc.lcsc.com/wmsc/upload/file/pdf/v2/lcsc/2304140030_FH--Guangdong-Fenghua-Advanced-Tech-0402B203K160NT_C1322352.pdf; ComponentLink2Description: JLCPCB Part URL; ComponentLink2URL: https://jlcpcb.com/partdetail/C1322352; ComponentLink3Description: LCSC Part URL; ComponentLink3URL: https://lcsc.com/product-detail/Multilayer-Ceramic-Capacitors-MLCC---SMD-SMT_FH-Guangdong-Fenghua-Advanced-Tech-FH-Guangdong-Fenghua-Advanced-Tech-0402B203K160NT_C1322352.html
footprint CAP-0402 (0402 (1005M) Capacitor)
pins: 1, 2

## 0402B203K500NT
designator C?  Capacitance: 20nF  (hidden comment: *)
Capacitor, Ceramic (MLCC), 20nF, ±10%, 50V, X7R, ±10%, SMD 0402; Manufacturer: FH (Guangdong Fenghua Advanced Tech); Manufacturer Part Number: 0402B203K500NT; Package Size: 0402; JLCPCB Basic Part: No; JLCPCB Part Number: C6563253; Supplier 1: LCSC; Category: Capacitors - MLCC; Supplier Part Number 1: C6563253; Tolerance: ±10%; Voltage Rating: 50V; Temperature Coefficient: X7R; RoHS: Yes; ComponentLink1Description: Datasheet; ComponentLink1URL: https://wmsc.lcsc.com/wmsc/upload/file/pdf/v2/lcsc/2305171547_FH--Guangdong-Fenghua-Advanced-Tech-0402B203K500NT_C6563253.pdf; ComponentLink2Description: JLCPCB Part URL; ComponentLink2URL: https://jlcpcb.com/partdetail/C6563253; ComponentLink3Description: LCSC Part URL; ComponentLink3URL: https://lcsc.com/product-detail/Multilayer-Ceramic-Capacitors-MLCC---SMD-SMT_FH-Guangdong-Fenghua-Advanced-Tech-FH-Guangdong-Fenghua-Advanced-Tech-0402B203K500NT_C6563253.html
footprint CAP-0402 (0402 (1005M) Capacitor)
pins: 1, 2

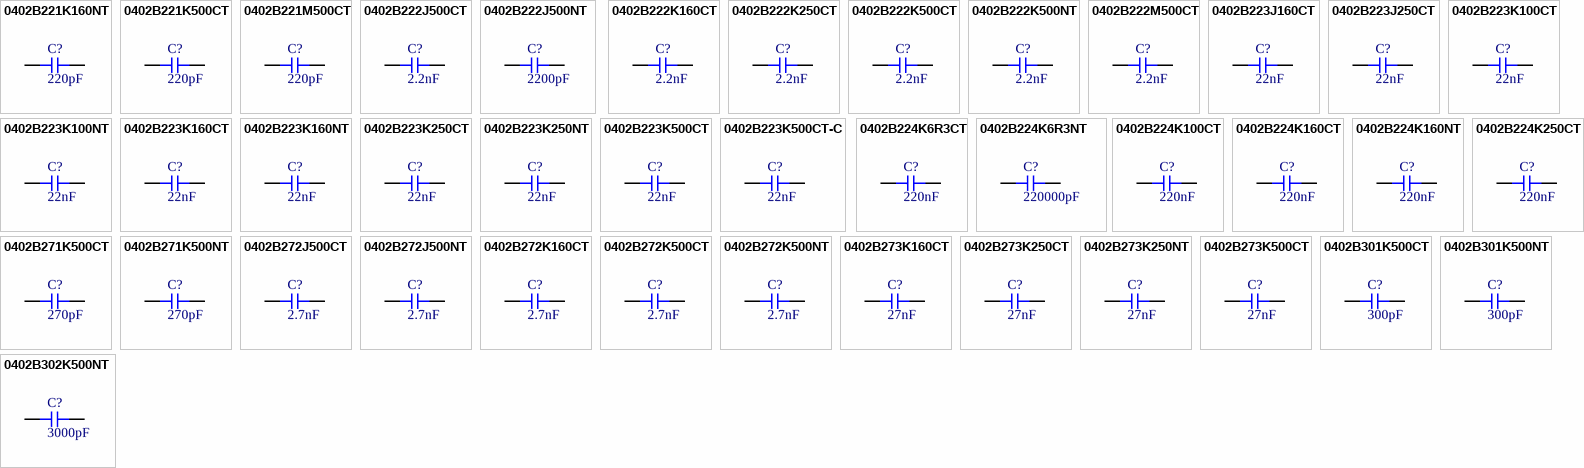
[diagram p2: symbols 0402B221K160NT to 0402B302K500NT]

## 0402B221K160NT
designator C?  Capacitance: 220pF  (hidden comment: *)
Capacitor, Ceramic (MLCC), 220pF, ±10%, 16V, X7R, ±10%, SMD 0402; Manufacturer: FH(Guangdong Fenghua Advanced Tech); Manufacturer Part Number: 0402B221K160NT; Package Size: 0402; JLCPCB Basic Part: No; JLCPCB Part Number: C507062; Supplier 1: LCSC; Category: Capacitors - MLCC; Supplier Part Number 1: C507062; Tolerance: ±10%; Voltage Rating: 16V; Temperature Coefficient: X7R; RoHS: Yes; ComponentLink1Description: Datasheet; ComponentLink1URL: https://wmsc.lcsc.com/wmsc/upload/file/pdf/v2/lcsc/2304140030_FH--Guangdong-Fenghua-Advanced-Tech-0402B221K160NT_C507062.pdf; ComponentLink2Description: JLCPCB Part URL; ComponentLink2URL: https://jlcpcb.com/partdetail/C507062; ComponentLink3Description: LCSC Part URL; ComponentLink3URL: https://lcsc.com/product-detail/Multilayer-Ceramic-Capacitors-MLCC---SMD-SMT_FH-Guangdong-Fenghua-Advanced-Tech-FH-Guangdong-Fenghua-Advanced-Tech-0402B221K160NT_C507062.html
footprint CAP-0402 (0402 (1005M) Capacitor)
pins: 1, 2

## 0402B221K500CT
designator C?  Capacitance: 220pF  (hidden comment: *)
Capacitor, Ceramic (MLCC), 220pF, ±10%, 50V, X7R, ±10%, SMD 0402; Manufacturer: Walsin Tech Corp; Manufacturer Part Number: 0402B221K500CT; Package Size: 0402; JLCPCB Basic Part: No; JLCPCB Part Number: C301934; Supplier 1: LCSC; Category: Capacitors - MLCC; Supplier Part Number 1: C301934; Tolerance: ±10%; Voltage Rating: 50V; Temperature Coefficient: X7R; RoHS: Yes; ComponentLink1Description: Datasheet; ComponentLink1URL: https://wmsc.lcsc.com/wmsc/upload/file/pdf/v2/lcsc/2304140030_Walsin-Tech-Corp-0402B221K500CT_C301934.pdf; ComponentLink2Description: JLCPCB Part URL; ComponentLink2URL: https://jlcpcb.com/partdetail/C301934; ComponentLink3Description: LCSC Part URL; ComponentLink3URL: https://lcsc.com/product-detail/Multilayer-Ceramic-Capacitors-MLCC---SMD-SMT_Walsin-Tech-Corp-Walsin-Tech-Corp-0402B221K500CT_C301934.html
footprint CAP-0402 (0402 (1005M) Capacitor)
pins: 1, 2

## 0402B221M500CT
designator C?  Capacitance: 220pF  (hidden comment: *)
Capacitor, Ceramic (MLCC), 220pF, ±20%, 50V, X7R, ±20%, SMD 0402; Manufacturer: Walsin Tech Corp; Manufacturer Part Number: 0402B221M500CT; Package Size: 0402; JLCPCB Basic Part: No; JLCPCB Part Number: C295924; Supplier 1: LCSC; Category: Capacitors - MLCC; Supplier Part Number 1: C295924; Tolerance: ±20%; Voltage Rating: 50V; Temperature Coefficient: X7R; RoHS: Yes; ComponentLink1Description: Datasheet; ComponentLink1URL: https://wmsc.lcsc.com/wmsc/upload/file/pdf/v2/lcsc/2304140030_Walsin-Tech-Corp-0402B221M500CT_C295924.pdf; ComponentLink2Description: JLCPCB Part URL; ComponentLink2URL: https://jlcpcb.com/partdetail/C295924; ComponentLink3Description: LCSC Part URL; ComponentLink3URL: https://lcsc.com/product-detail/Multilayer-Ceramic-Capacitors-MLCC---SMD-SMT_Walsin-Tech-Corp-Walsin-Tech-Corp-0402B221M500CT_C295924.html
footprint CAP-0402 (0402 (1005M) Capacitor)
pins: 1, 2

## 0402B222J500CT
designator C?  Capacitance: 2.2nF  (hidden comment: *)
Capacitor, Ceramic (MLCC), 2.2nF, ±5%, 50V, X7R, ±5%, SMD 0402; Manufacturer: Walsin Tech Corp; Manufacturer Part Number: 0402B222J500CT; Package Size: 0402; JLCPCB Basic Part: No; JLCPCB Part Number: C152804; Supplier 1: LCSC; Category: Capacitors - MLCC; Supplier Part Number 1: C152804; Tolerance: ±5%; Voltage Rating: 50V; Temperature Coefficient: X7R; RoHS: Yes; ComponentLink1Description: Datasheet; ComponentLink1URL: https://wmsc.lcsc.com/wmsc/upload/file/pdf/v2/lcsc/2304140030_Walsin-Tech-Corp-0402B222J500CT_C152804.pdf; ComponentLink2Description: JLCPCB Part URL; ComponentLink2URL: https://jlcpcb.com/partdetail/C152804; ComponentLink3Description: LCSC Part URL; ComponentLink3URL: https://lcsc.com/product-detail/Multilayer-Ceramic-Capacitors-MLCC---SMD-SMT_Walsin-Tech-Corp-Walsin-Tech-Corp-0402B222J500CT_C152804.html
footprint CAP-0402 (0402 (1005M) Capacitor)
pins: 1, 2

## 0402B222J500NT
designator C?  Capacitance: 2200pF  (hidden comment: *)
Capacitor, Ceramic (MLCC), 2200pF, ±5%, 50V, X7R, ±5%, SMD 0402; Manufacturer: FH (Guangdong Fenghua Advanced Tech); Manufacturer Part Number: 0402B222J500NT; Package Size: 0402; JLCPCB Basic Part: No; JLCPCB Part Number: C913886; Supplier 1: LCSC; Category: Capacitors - MLCC; Supplier Part Number 1: C913886; Tolerance: ±5%; Voltage Rating: 50V; Temperature Coefficient: X7R; RoHS: Yes; ComponentLink1Description: Datasheet; ComponentLink1URL: https://wmsc.lcsc.com/wmsc/upload/file/pdf/v2/lcsc/2304140030_FH--Guangdong-Fenghua-Advanced-Tech-0402B222J500NT_C913886.pdf; ComponentLink2Description: JLCPCB Part URL; ComponentLink2URL: https://jlcpcb.com/partdetail/C913886; ComponentLink3Description: LCSC Part URL; ComponentLink3URL: https://lcsc.com/product-detail/Multilayer-Ceramic-Capacitors-MLCC---SMD-SMT_FH-Guangdong-Fenghua-Advanced-Tech-FH-Guangdong-Fenghua-Advanced-Tech-0402B222J500NT_C913886.html
footprint CAP-0402 (0402 (1005M) Capacitor)
pins: 1, 2

## 0402B222K160CT
designator C?  Capacitance: 2.2nF  (hidden comment: *)
Capacitor, Ceramic (MLCC), 2.2nF, ±10%, 16V, X7R, ±10%, SMD 0402; Manufacturer: Walsin Tech Corp; Manufacturer Part Number: 0402B222K160CT; Package Size: 0402; JLCPCB Basic Part: No; JLCPCB Part Number: C387948; Supplier 1: LCSC; Category: Capacitors - MLCC; Supplier Part Number 1: C387948; Tolerance: ±10%; Voltage Rating: 16V; Temperature Coefficient: X7R; RoHS: Yes; ComponentLink1Description: Datasheet; ComponentLink1URL: https://wmsc.lcsc.com/wmsc/upload/file/pdf/v2/lcsc/2304140030_Walsin-Tech-Corp-0402B222K160CT_C387948.pdf; ComponentLink2Description: JLCPCB Part URL; ComponentLink2URL: https://jlcpcb.com/partdetail/C387948; ComponentLink3Description: LCSC Part URL; ComponentLink3URL: https://lcsc.com/product-detail/Multilayer-Ceramic-Capacitors-MLCC---SMD-SMT_Walsin-Tech-Corp-Walsin-Tech-Corp-0402B222K160CT_C387948.html
footprint CAP-0402 (0402 (1005M) Capacitor)
pins: 1, 2
